# Altium footprint library YS_PCBLIB.PcbLib: 133 footprints (part 5 of 9)
Each footprint in its own frame and in the unit in brackets; x right, y up, seen from the top. Pads: shape width x height; smd on the part's side, far side on the other; paste and mask are expansions set on the pad; w line width, h text height; cw(c..) or ccw(c..) is an arc to the next point about the centre after c.
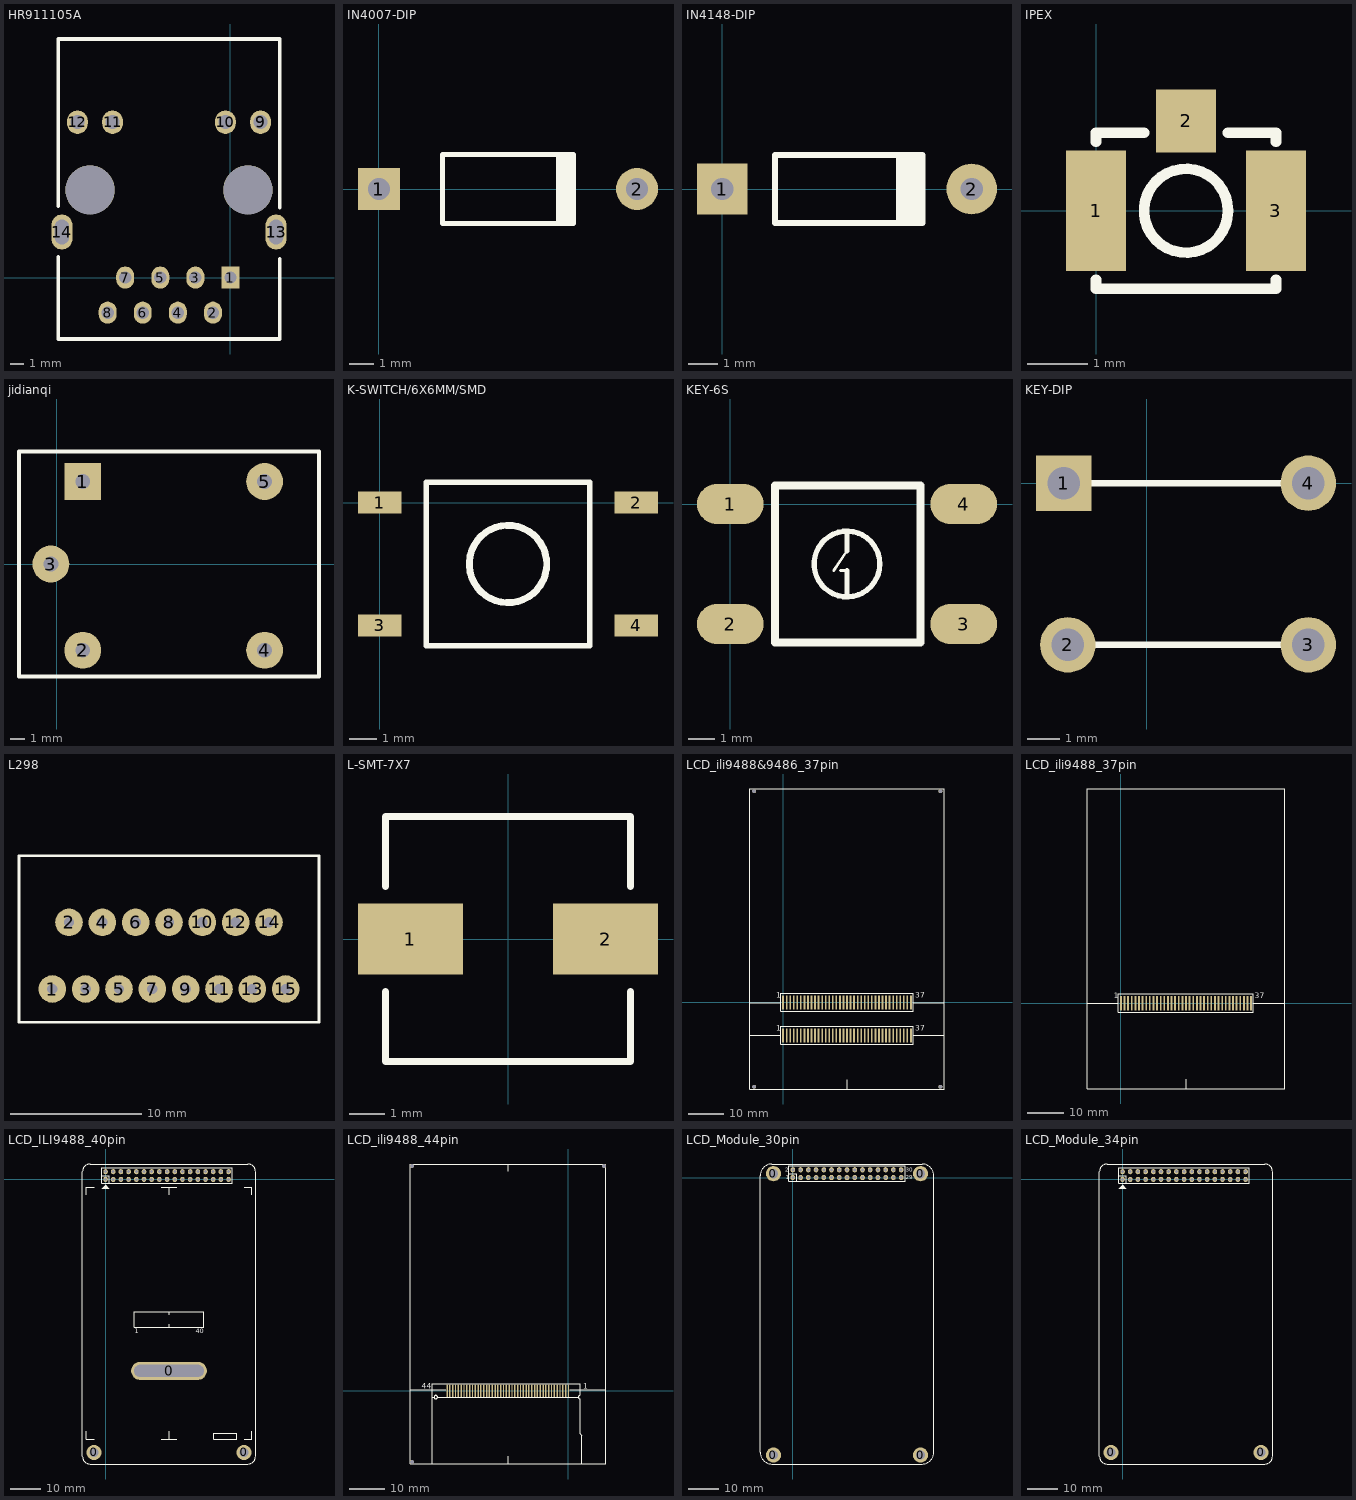
[diagram p4: the footprints below, top view; thin cyan lines are the x and y axes]

## HR911105A [mm] "HR911105A"
pads (16):
  rect 1.3x1.6 hole 0.89: 1(0,0)
  oval 1.3x1.6 hole 0.89: 2(-1.27,-2.54) 3(-2.54,0) 4(-3.81,-2.54) 5(-5.08,0) 6(-6.35,-2.54) 7(-7.62,0) 8(-8.89,-2.54)
  oval 1.5x1.7 hole 1.02: 9(2.175,11.25) 10(-0.365,11.25) 11(-8.535,11.25) 12(-11.075,11.25)
  oval 1.524x2.54 hole 1.016 slot 1.778 at 90 deg: 13(3.3,3.3) 14(-12.2,3.3)
  round 3.556 hole 3.556: ""(-10.165,6.35) ""(1.265,6.35)
Top Overlay:
  lines w0.254: -12.45,1.503 -12.45,-4.445 3.55,-4.445 3.55,1.372 ; -12.45,5.147 -12.45,17.27 3.55,17.27 3.55,5.053

## IN4007-DIP [mm] "Diode, Axial; Body 5.2 x 2.7 mm (LxDia. max), Lead Dia. 0.86 mm (max)"
height 2.8
pads (2):
  rect 1.7x1.7 hole 0.9: 1(0,0)
  round 1.7 hole 0.9: 2(10.46,0)
Top Overlay:
  rectangle: 7.18,-1.4 7.98,1.4
  lines w0.2: 7.88,-1.4 2.58,-1.4 2.58,1.4 7.88,1.4

## IN4148-DIP [mm]
pads (2):
  rect 1.7x1.7 hole 0.75: 1(0,0)
  round 1.7 hole 0.75: 2(8.382,0)
Top Overlay:
  rectangle: 5.842,-1.143 6.731,1.143
  lines w0.2: 1.778,-1.143 6.731,-1.143 6.731,1.143 1.778,1.143 1.778,-1.143

## IPEX [mm]
pads (3):
  rect 1x2 smd: 1(0,0) 3(3,0)
  rect 1x1.05 smd: 2(1.5,1.5)
Top Overlay:
  circle w0.178: c1.5,0 r0.7
  lines w0.178: 0,-1.15 0,-1.3 3,-1.3 3,-1.15 ; 0,1.15 0,1.3 0.8,1.3 ; 2.2,1.3 3,1.3 3,1.15

## jidianqi [mm]
pads (5):
  rect 2.5x2.5 hole 1: 1(1.778,5.588)
  round 2.5 hole 1: 2(1.778,-5.842) 3(-0.381,0) 4(14.097,-5.842) 5(14.097,5.588)
Top Overlay:
  lines w0.25: -2.54,-7.62 17.78,-7.62 17.78,7.62 -2.54,7.62 -2.54,-6.096 -2.54,-7.62

## K-SWITCH/6X6MM/SMD [mm]
pads (4):
  rect 1.6x0.8 smd: 1(0,0) 2(9.4,0) 3(0,-4.5) 4(9.4,-4.5)
Top Overlay:
  circle w0.254: c4.7,-2.25 r1.42
  lines w0.2: 1.7,-5.25 1.7,0.75 7.7,0.75 7.7,-5.25 1.7,-5.25

## KEY-6S [mil]
height 120
pads (4):
  oval 100x60 smd: 1(0,0) 2(0,-180) 3(350,-180) 4(350,0)
Top Overlay:
  circle w8: c175,-90 r49.21
  lines w4: 155.31,-99.84 175,-70.31 ; 165.16,-99.84 175,-99.84
  lines w8: 175,-139.21 175,-99.84 ; 175,-70.31 175,-40.79
  lines w12: 66.89,-208.11 285,-208.11 285,28.11 66.89,28.11 66.89,-208.11

## KEY-DIP [mm]
pads (4):
  rect 1.7x1.7 hole 1: 1(-2.54,0)
  round 1.7 hole 1: 2(-2.413,-4.953) 3(4.953,-4.953) 4(4.953,0)
Top Overlay:
  lines w0.2: -2.54,0 4.953,0 ; -2.413,-4.953 4.953,-4.953

## L298 [mm]
pads (15):
  round 2.1 hole 0.8: 1(-24.511,-21.717) 2(-23.241,-16.637) 3(-21.971,-21.717) 4(-20.701,-16.637) 5(-19.431,-21.717) 6(-18.161,-16.637) 7(-16.891,-21.717) 8(-15.621,-16.637) 9(-14.351,-21.717) 10(-13.081,-16.637) 11(-11.811,-21.717) 12(-10.541,-16.637) 13(-9.271,-21.717) 14(-8.001,-16.637) 15(-6.731,-21.717)
Top Overlay:
  lines w0.2: -27.051,-24.257 -4.191,-24.257 -4.191,-11.557 -27.051,-11.557 -27.051,-24.257

## L-SMT-7X7 [mil]
pads (2):
  rect 118.11x80 smd: 1(-110,0) 2(110,0)
Top Overlay:
  lines w7.87: -137.79,-59.05 -137.79,-137.79 137.8,-137.79 137.8,-59.05 ; -137.79,59.06 -137.79,137.8 137.8,137.8 137.8,59.06

## LCD_ili9488&9486_37pin [mm]
pads (78):
  rect 0.5x4 smd: 1(0,-9.271) 1(0,0) 2(1,-9.271) 2(1,0) 3(2,-9.271) 3(2,0) 4(3,-9.271) 4(3,0) 5(4,-9.271) 5(4,0) 6(5,-9.271) 6(5,0) 7(6,-9.271) 7(6,0) 8(7,-9.271) 8(7,0) 9(8,-9.271) 9(8,0) 10(9,-9.271) 10(9,0) 11(10,-9.271) 11(10,0) 12(11,-9.271) 12(11,0) 13(12,-9.271) 13(12,0) 14(13,-9.271) 14(13,0) 15(14,-9.271) 15(14,0) 16(15,-9.271) 16(15,0) 17(16,-9.271) 17(16,0) 18(17,-9.271) 18(17,0) 19(18,-9.271) 19(18,0) 20(19,-9.271) 20(19,0) 21(20,-9.271) 21(20,0) 22(21,-9.271) 22(21,0) 23(22,-9.271) 23(22,0) 24(23,-9.271) 24(23,0) 25(24,-9.271) 25(24,0) 26(25,-9.271) 26(25,0) 27(26,-9.271) 27(26,0) 28(27,-9.271) 28(27,0) 29(28,-9.271) 29(28,0) 30(29,-9.271) 30(29,0) 31(30,-9.271) 31(30,0) 32(31,-9.271) 32(31,0) 33(32,-9.271) 33(32,0) 34(33,-9.271) 34(33,0) 35(34,-9.271) 35(34,0) 36(35,-9.271) 36(35,0) 37(36,-9.271) 37(36,0)
  round 1.1 hole 1.1: ""(-8.187,-23.749) ""(-8.187,59.504) ""(44.323,-23.749) ""(44.323,59.504)
Top Overlay:
  lines w0.2: -9.33,-24.384 45.33,-24.384 ; -9.33,-0.025 -0.694,-0.025 ; 18,-24.384 18,-21.717 ; 36.644,-0.025 45.33,-0.025
  lines w0.203: -9.33,-24.384 -9.33,60.139 45.33,60.139 45.33,58.547 45.33,-24.384 ; -9.33,-9.271 -0.719,-9.271 ; 36.644,-9.271 45.33,-9.271 ; -0.694,-11.811 36.644,-11.811 36.644,-6.731 -0.694,-6.731 -0.694,-9.296 -0.694,-11.811 ; -0.694,-2.54 -0.694,-0.025 -0.694,2.54 36.644,2.54 36.644,-2.54 -0.694,-2.54
  text "1" at -1.964,1.27 h1.52
  text "37" at 37.211,1.27 h1.52
  text "37" at 37.211,-8.001 h1.52
  text "1" at -1.964,-8.001 h1.52

## LCD_ili9488_37pin [mm]
pads (37):
  rect 0.5x4 smd: 1(0,0) 2(1,0) 3(2,0) 4(3,0) 5(4,0) 6(5,0) 7(6,0) 8(7,0) 9(8,0) 10(9,0) 11(10,0) 12(11,0) 13(12,0) 14(13,0) 15(14,0) 16(15,0) 17(16,0) 18(17,0) 19(18,0) 20(19,0) 21(20,0) 22(21,0) 23(22,0) 24(23,0) 25(24,0) 26(25,0) 27(26,0) 28(27,0) 29(28,0) 30(29,0) 31(30,0) 32(31,0) 33(32,0) 34(33,0) 35(34,0) 36(35,0) 37(36,0)
Top Overlay:
  lines w0.2: -9.33,-0.025 -0.694,-0.025 ; -9.33,59.182 -9.33,-23.749 45.33,-23.749 ; 18,-23.749 18,-21.082 ; 36.644,-0.025 45.33,-0.025
  lines w0.203: -9.33,59.182 45.33,59.182 45.33,-23.749 ; -0.694,-2.54 -0.694,-0.025 -0.694,2.54 36.644,2.54 36.644,-2.54 -0.694,-2.54
  text "1" at -1.964,1.27 h1.52
  text "37" at 37.025,1.27 h1.52

## LCD_ILI9488_40pin [mm]
pads (37):
  round 5 hole 3: 0(-3.81,-90.17) 0(45.72,-90.17)
  oval 25x6 hole 4 slot 23 at 0 deg: 0(20.955,-63.225)
  oval 1.5x1.7 hole 1: 1(0,0) 2(0,2.54) 3(2.54,0) 4(2.54,2.54) 5(5.08,0) 6(5.08,2.54) 7(7.62,0) 8(7.62,2.54) 9(10.16,0) 10(10.16,2.54) 11(12.7,0) 12(12.7,2.54) 13(15.24,0) 14(15.24,2.54) 15(17.78,0) 16(17.78,2.54) 17(20.32,0) 18(20.32,2.54) 19(22.86,0) 20(22.86,2.54) 21(25.4,0) 22(25.4,2.54) 23(27.94,0) 24(27.94,2.54) 25(30.48,0) 26(30.48,2.54) 27(33.02,0) 28(33.02,2.54) 29(35.56,0) 30(35.56,2.54) 31(38.1,0) 32(38.1,2.54) 33(40.64,0) 34(40.64,2.54)
Top Overlay:
  region: 0,-1.778 -1.27,-3.048 1.27,-3.048
  lines w0.2: -6.35,-83.185 -6.35,-85.725 -3.81,-85.725 ; -6.35,-5.08 -6.35,-2.54 -3.81,-2.54 ; -1.27,1.27 1.27,1.27 1.27,-1.27 ; 18.415,-85.725 20.955,-85.725 ; 18.415,-2.54 23.495,-2.54 ; 20.066,-43.688 32.385,-43.688 32.385,-48.768 9.525,-48.768 ; 20.955,-83.185 20.955,-85.725 ; 20.955,-47.752 20.955,-48.768 9.525,-48.768 ; 20.955,-44.704 20.955,-43.688 9.525,-43.688 9.525,-48.768 ; 20.955,-5.08 20.955,-2.54 ; 23.495,-85.725 20.955,-85.725 ; 45.72,-85.725 48.26,-85.725 48.26,-83.185 ; 45.72,-2.54 48.26,-2.54 48.26,-5.08 ; -7.62,-91.44 ccw(c-5.08,-91.44) -5.08,-93.98 46.99,-93.98 ccw(c46.99,-91.44) 49.53,-91.44 49.53,2.54 ccw(c46.99,2.54) 46.99,5.08 -5.08,5.08 ccw(c-5.08,2.54) -7.62,2.54 -7.62,-91.44 ; -1.27,-1.27 -1.27,3.81 41.91,3.81 41.91,-1.27 -1.27,-1.27 ; 35.687,-85.725 38.1,-85.725 43.307,-85.725 43.307,-83.82 39.37,-83.82 35.687,-83.82 35.687,-85.725
  text "1" at 9.652,-50.8 h1.52
  text "40" at 29.718,-50.8 h1.52

## LCD_ili9488_44pin [mm]
pads (47):
  rect 0.4x3.5 smd: 1(0,0) 2(-0.8,0) 3(-1.6,0) 4(-2.4,0) 5(-3.2,0) 6(-4,0) 7(-4.8,0) 8(-5.6,0) 9(-6.4,0) 10(-7.2,0) 11(-8,0) 12(-8.8,0) 13(-9.6,0) 14(-10.4,0) 15(-11.2,0) 16(-12,0) 17(-12.8,0) 18(-13.6,0) 19(-14.4,0) 20(-15.2,0) 21(-16,0) 22(-16.8,0) 23(-17.6,0) 24(-18.4,0) 25(-19.2,0) 26(-20,0) 27(-20.8,0) 28(-21.6,0) 29(-22.4,0) 30(-23.2,0) 31(-24,0) 32(-24.8,0) 33(-25.6,0) 34(-26.4,0) 35(-27.2,0) 36(-28,0) 37(-28.8,0) 38(-29.6,0) 39(-30.4,0) 40(-31.2,0) 41(-32,0) 42(-32.8,0) 43(-33.6,0) 44(-34.4,0)
  round 1.143 hole 1.143: ""(-44.374,-20.142) ""(-44.374,63.703) ""(10.109,63.703)
Top Overlay:
  circle w0.203: c-37.592,-1.778 r0.5
  lines w0.2: -44.88,-20.701 -44.88,64.262 ; -44.88,0.254 -38.608,0.254 ; -35.052,2.032 0.635,2.032 ; -17.13,-20.701 -17.13,-18.542 ; -17.13,62.23 -17.13,64.262 ; 3.302,0.254 10.619,0.254 ; 10.619,-20.701 10.619,64.262
  lines w0.203: -44.88,-20.701 10.619,-20.701 ; -44.88,64.262 10.619,64.262 ; -38.608,-20.701 -38.608,2.032 -35.052,2.032 ; -38.608,0.254 -34.798,0.254 ; -38.481,-1.778 -38.1,-1.778 ; -37.092,-1.778 2.794,-1.778 ; 0.381,0.254 3.302,0.254 ; 0.635,2.032 3.302,2.032 3.302,-1.278 ccw(c3.302,-1.778) 3.302,-2.278 3.302,-12.192 3.81,-12.7 3.81,-20.701
  text "1" at 4.191,0.635 h1.52
  text "44" at -41.529,0.635 h1.52

## LCD_Module_30pin [mm]
pads (34):
  round 5 hole 3.05: 0(-6.35,-91.059) 0(-6.35,1.27) 0(41.91,-91.059) 0(41.91,1.27)
  oval 1.5x1.7 hole 1: 1(0,0) 2(0,2.54) 3(2.54,0) 4(2.54,2.54) 5(5.08,0) 6(5.08,2.54) 7(7.62,0) 8(7.62,2.54) 9(10.16,0) 10(10.16,2.54) 11(12.7,0) 12(12.7,2.54) 13(15.24,0) 14(15.24,2.54) 15(17.78,0) 16(17.78,2.54) 17(20.32,0) 18(20.32,2.54) 19(22.86,0) 20(22.86,2.54) 21(25.4,0) 22(25.4,2.54) 23(27.94,0) 24(27.94,2.54) 25(30.48,0) 26(30.48,2.54) 27(33.02,0) 28(33.02,2.54) 29(35.56,0) 30(35.56,2.54)
Top Overlay:
  lines w0.2: -10.668,-90.17 ccw(c-6.858,-90.17) -6.858,-93.98 42.418,-93.98 ccw(c42.418,-90.17) 46.228,-90.17 ; -10.668,0.635 cw(c-6.858,0.635) -6.858,4.445 42.418,4.445 cw(c42.418,0.635) 46.228,0.635 ; -1.27,1.27 1.27,1.27 1.27,-1.27 ; -1.27,-1.27 36.83,-1.27 36.83,3.81 -1.27,3.81 -1.27,-1.27
  lines w0.203: -10.668,-90.17 -10.668,0.635 ; 46.228,-90.17 46.228,0.635
  text "30" at 37.084,1.905 h1.27
  text "29" at 37.084,-0.635 h1.27
  text "1" at -2.286,-0.635 h1.27
  text "2" at -2.54,1.905 h1.27

## LCD_Module_34pin [mm]
pads (36):
  round 5 hole 3.05: 0(-3.81,-90.17) 0(45.72,-90.17)
  oval 1.5x1.7 hole 1: 1(0,0) 2(0,2.54) 3(2.54,0) 4(2.54,2.54) 5(5.08,0) 6(5.08,2.54) 7(7.62,0) 8(7.62,2.54) 9(10.16,0) 10(10.16,2.54) 11(12.7,0) 12(12.7,2.54) 13(15.24,0) 14(15.24,2.54) 15(17.78,0) 16(17.78,2.54) 17(20.32,0) 18(20.32,2.54) 19(22.86,0) 20(22.86,2.54) 21(25.4,0) 22(25.4,2.54) 23(27.94,0) 24(27.94,2.54) 25(30.48,0) 26(30.48,2.54) 27(33.02,0) 28(33.02,2.54) 29(35.56,0) 30(35.56,2.54) 31(38.1,0) 32(38.1,2.54) 33(40.64,0) 34(40.64,2.54)
Top Overlay:
  region: 0,-1.778 -1.27,-3.048 1.27,-3.048
  lines w0.2: -1.27,1.27 1.27,1.27 1.27,-1.27 ; -7.62,-91.44 ccw(c-5.08,-91.44) -5.08,-93.98 46.99,-93.98 ccw(c46.99,-91.44) 49.53,-91.44 49.53,2.54 ccw(c46.99,2.54) 46.99,5.08 -5.08,5.08 ccw(c-5.08,2.54) -7.62,2.54 -7.62,-91.44 ; -1.27,-1.27 41.91,-1.27 41.91,3.81 -1.27,3.81 -1.27,-1.27